# Altium schematic symbol library Electronic Devices_LIB.SchLib: 703 symbols (part 1 of 8) (continued)
## CAP_1UF_25V_X5R_0402
designator C?, comment Voltage Rating: 25V  Capacitance: 1uF  Case Code (Imperial): 0402  (hidden comment: GRM155R61E105KA12D)
Multilayer Ceramic Capacitor, 1 uF, 25 V, ± 10%, X5R, 0402 [1005 Metric]; Manufacturer: Murata; Supplier 1: Digi-Key; Manufacturer Part Number: GRM155R61E105KA12D; RoHS: Yes; Category: Ceramic Capacitors; Stock 1: 849086; Pricing 1: 1=0.1, 10=0.043, 50=0.0246, 100=0.019, 500=0.01434, 1000=0.01126, 2500=0.01024, 5000=0.00942 (USD); Mount: Surface Mount; Case/Package: 0402; Case Code (Metric): 1005; Material: Ceramic; Weight: 0.000212oz; Min Operating Temperature: -55°C; Max Operating Temperature: 85°C; Tolerance: 10%; Packaging: Cut Tape; Dielectric: X5R; Voltage: 25V; Termination: SMD/SMT; Voltage Rating (DC): 25V; Package Quantity: 10000; Series: GRM; Length: 1mm; Width: 0.5mm; Height: 0.5mm; Thickness: 0.022inch; Depth: 0.5mm; Reach SVHC Compliant: No; Lead Free: Lead Free; RoHS Compliant: Yes; ComponentLink1URL: https://datasheet.ciiva.com/7719/1666664-7719006.pdf?src-supplier=Element14; ComponentLink1Description: https://datasheet.ciiva.com/7719/1666664-7719006.pdf?src-supplier=Element14; ComponentLink2URL: https://datasheet.ciiva.com/22732/1666664-22732122.pdf?src-supplier=Element14; ComponentLink2Description: https://datasheet.ciiva.com/22732/1666664-22732122.pdf?src-supplier=Element14; Supplier Part Number 1: 490-10017-1-ND
footprint CAP_0402_CAPC1005X05N (Chip Capacitor, 2-Leads, Body 1.00x0.50mm, IPC Medium Density)
pins: 1, 2

## CAP_1uF_25V_X7R_0603
designator C?, comment Voltage Rating: 25V  Capacitance: 1uF  Case/Package: 0603  (hidden comment: GCM188R71E105KA64D)
Multilayer Ceramic Capacitor, 1 uF, 25 V, ± 10%, X7R, 0603 [1608 Metric]; Manufacturer: Murata; Material: 4241ConductorMaterial; Supplier 1: Mouser; Manufacturer Part Number: GCM188R71E105KA64D; RoHS: Yes; Category: Ceramic Capacitors; Stock 1: 413087; Pricing 1: 1=0.22, 10=0.089, 50=0.089, 100=0.052, 1000=0.046, 10000=0.035 (USD); Mount: Surface Mount; Case Code (Metric): 1608; Case Code (Imperial): 0603; Weight: 0.000222oz; Min Operating Temperature: -55°C; Max Operating Temperature: 125°C; Tolerance: 10%; Packaging: Tape and Reel; Dielectric: X7R; Voltage: 25V; Termination: SMD/SMT; Voltage Rating (DC): 25V; Package Quantity: 4000; Series: GCM; Construction: Flat; Length: 1.6mm; Width: 0.031inch; Height: 0.8mm; Thickness: 0.035inch; Depth: 0.8mm; Ratings: AEC-Q200; Radiation Hardening: No; Reach SVHC Compliant: No; Lead Free: Lead Free; RoHS Compliant: Yes; ComponentLink1URL: https://datasheet.ciiva.com/11616/product-11616499.pdf?src-supplier=Avnet; ComponentLink1Description: https://datasheet.ciiva.com/11616/product-11616499.pdf?src-supplier=Avnet; Supplier Part Number 1: 81-GCM188R71E105KA4D
footprint CAP_0603_CAPC1608X08N (Chip Capacitor, 2-Leads, Body 1.60x0.80mm, IPC Medium Density)
pins: 1, 2

## CAP_1uF_35V_JB_0402
designator C?, comment Voltage Rating: 35V  Capacitance: 1uF  Case/Package: 0402  (hidden comment: C1005JB1V105K050BC)
Cap Ceramic 1uF 35V JB 10% SMD 0402 85°C Punched Paper T/R; Manufacturer: TDK; Material: 4241ConductorMaterial; Supplier 1: Digikey; Manufacturer Part Number: C1005JB1V105K050BC; RoHS: Yes; Category: Ceramic Capacitors; Stock 1: 17379; Pricing 1: 1=0.17, 10=0.095, 50=0.0662, 100=0.0574, 500=0.04248, 1000=0.03785, 2500=0.03294, 5000=0.02996 (USD); Mount: Surface Mount; Case Code (Metric): 1005; Case Code (Imperial): 0402; Weight: 0.001199oz; Dielectric Material: Ceramic; Min Operating Temperature: -25°C; Max Operating Temperature: 85°C; Package Quantity: 10000; Packaging: Tape and Reel; Tolerance: 10%; Termination: SMD/SMT; Voltage Rating (DC): 35V; Series: C; Length: 0.039inch; Width: 0.02inch; Height: 550um; Thickness: 0.022inch; Lead Free: Lead Free; RoHS Compliant: Yes; ComponentLink1URL: https://datasheet.ciiva.com/14885/tdkmlcccaprange-14885800.pdf?src-supplier=Digikey; ComponentLink1Description: https://datasheet.ciiva.com/14885/tdkmlcccaprange-14885800.pdf?src-supplier=Digikey; ComponentLink2URL: https://datasheet.ciiva.com/14885/tdkmlcccaprange-14885801.pdf?src-supplier=Digikey; ComponentLink2Description: https://datasheet.ciiva.com/14885/tdkmlcccaprange-14885801.pdf?src-supplier=Digikey; ComponentLink3URL: https://datasheet.ciiva.com/14885/tdkmlcccaprange-14885802.pdf?src-supplier=Digikey; ComponentLink3Description: https://datasheet.ciiva.com/14885/tdkmlcccaprange-14885802.pdf?src-supplier=Digikey; Supplier Part Number 1: 445-11014-1-ND
footprint CAP_0402_CAPC1005X05N (Chip Capacitor, 2-Leads, Body 1.00x0.50mm, IPC Medium Density)
pins: 1, 2

## CAP_1uF_35V_X5R_0603
designator C?, comment GMK107BJ105KA-T  Voltage Rating (DC): 35V  Capacitance: 1uF  Case/Package: 0603
Multilayer Ceramic Capacitors (High dielectric type), 35V, 1 uF, ± 10 %, 0603, X5R, RoHS; Manufacturer: Taiyo Yuden; Dielectric Material: 4241ConductorMaterial; Tolerance: 10%; Supplier 1: Digikey; Manufacturer Part Number: GMK107BJ105KA-T; RoHS: Yes; Category: Ceramic Capacitors; Stock 1: 1326938; Pricing 1: 1=0.17, 10=0.108, 50=0.0682, 100=0.0545, 500=0.0394, 1000=0.03484 (USD); Mount: Surface Mount; Case Code (Metric): 1608; Case Code (Imperial): 0603; Material: 4241ConductorMaterial; Min Operating Temperature: -55°C; Max Operating Temperature: 85°C; Packaging: Tape and Reel; Dielectric: X5R; Voltage Rating: 35V; Package Quantity: 4000; Termination: SMD/SMT; Series: M; Construction: Flat; Length: 1.6mm; Width: 0.8mm; Height: 0.8mm; Depth: 0.8mm; Radiation Hardening: No; Halogen Free: 5694HalogenFree; RoHS Compliant: Yes; Lead Free: 5697LeadFree; Reach SVHC Compliant: No; ComponentLink1URL: https://datasheet.ciiva.com/134/gmk107bj105ka-t-ss-134746.pdf?src-supplier=Digikey; ComponentLink1Description: https://datasheet.ciiva.com/134/gmk107bj105ka-t-ss-134746.pdf?src-supplier=Digikey; ComponentLink2URL: https://datasheet.ciiva.com/30065/198gmk107bj105ka-t-30065053.pdf?src-supplier=Onlinecomponents.com; ComponentLink2Description: https://datasheet.ciiva.com/30065/198gmk107bj105ka-t-30065053.pdf?src-supplier=Onlinecomponents.com; ComponentLink3URL: https://datasheet.ciiva.com/11463/gmk107bj105ka-t-ss-11463824.pdf?src-supplier=Avnet; ComponentLink3Description: https://datasheet.ciiva.com/11463/gmk107bj105ka-t-ss-11463824.pdf?src-supplier=Avnet; ComponentLink4URL: https://datasheet.ciiva.com/15920/1014gmk107bj105ka-t-15920678.pdf?src-supplier=Onlinecomponents.com; ComponentLink4Description: https://datasheet.ciiva.com/15920/1014gmk107bj105ka-t-15920678.pdf?src-supplier=Onlinecomponents.com; ComponentLink5URL: https://datasheet.ciiva.com/26871/getdatasheetpartid-637436-26871549.pdf?src-supplier=Verical; ComponentLink5Description: https://datasheet.ciiva.com/26871/getdatasheetpartid-637436-26871549.pdf?src-supplier=Verical; ComponentLink6URL: https://datasheet.ciiva.com/30181/9gmk107bj105ka-t-30181659.pdf?src-supplier=Onlinecomponents.com; ComponentLink6Description: https://datasheet.ciiva.com/30181/9gmk107bj105ka-t-30181659.pdf?src-supplier=Onlinecomponents.com; ComponentLink7URL: https://datasheet.ciiva.com/5415/mlcc-all-e-541559-5415038.pdf?src-supplier=Mouser; ComponentLink7Description: https://datasheet.ciiva.com/5415/mlcc-all-e-541559-5415038.pdf?src-supplier=Mouser; Supplier Part Number 1: 587-1437-6-ND
footprint CAP_0603_CAPC1608X08N (Chip Capacitor, 2-Leads, Body 1.60x0.80mm, IPC Medium Density)
pins: 1, 2

## CAP_1uF_250V_X7R_2220
designator C?, comment Voltage Rating: 250V  Capacitance: 1uF  Case/Package: 2220  (hidden comment: CGA9N3X7R2E105K230KA)
Multilayer Ceramic Capacitor, 1 uF, 250 V, ± 10%, X7R, 2220 [5750 Metric]; Manufacturer: TDK; Material: 4241ConductorMaterial; Supplier 1: Mouser; Manufacturer Part Number: CGA9N3X7R2E105K230KA; RoHS: Yes; Category: Ceramic Capacitors; Stock 1: 19484; Pricing 1: 1=1.01, 10=0.807, 50=0.807, 100=0.606, 500=0.458, 1000=0.404, 2500=0.377, 5000=0.363, 10000=0.343, 25000=0.336 (USD); Mount: Surface Mount; Case Code (Metric): 5750; Case Code (Imperial): 2220; Weight: 0.016932oz; Min Operating Temperature: -55°C; Max Operating Temperature: 125°C; Tolerance: 10%; Packaging: Tape and Reel; Termination: SMD/SMT; Series: CGA; Package Quantity: 500; Voltage Rating (DC): 250V; Dielectric: X7R; Length: 5.7mm; Width: 0.197inch; Height: 2.3mm; Thickness: 0.091inch; Depth: 5mm; Ratings: AEC-Q200; Reach SVHC Compliant: No; Lead Free: Lead Free; RoHS Compliant: Yes; ComponentLink1URL: https://datasheet.ciiva.com/46443/1839935-46443611.pdf?src-supplier=Element14; ComponentLink1Description: https://datasheet.ciiva.com/46443/1839935-46443611.pdf?src-supplier=Element14; ComponentLink2URL: https://datasheet.ciiva.com/46443/1839935-46443610.pdf?src-supplier=Element14; ComponentLink2Description: https://datasheet.ciiva.com/46443/1839935-46443610.pdf?src-supplier=Element14; ComponentLink3URL: https://datasheet.ciiva.com/24216/mlcc-automotive-midvoltage-en-355485-24216919.pdf?src-supplier=Mouser; ComponentLink3Description: https://datasheet.ciiva.com/24216/mlcc-automotive-midvoltage-en-355485-24216919.pdf?src-supplier=Mouser; Supplier Part Number 1: 810-CGA9N3X7R2E105K
footprint CAP_2220_CAPC5750X25N (Chip Capacitor, 2-Leads, Body 5.70x5.00mm, IPC Medium Density)
pins: 1, 2

## CAP_01uF_275V_Film_cap_890324023023
designator C?, comment Capacitance: 100nF  Voltage Rating (AC): 275V  (hidden comment: 890324023023)
WCAP-FTX2 Radial Film Capacitor 0.512Lx0.276W 13.00mmx7.00mm ±10% 0.1muF 275V; Manufacturer: Wurth Electronics; Dielectric Material: PP; Ratings: X2; Supplier 1: Digikey; Manufacturer Part Number: 890324023023; RoHS: Yes; Category: Film Capacitors; Stock 1: 3473; Pricing 1: 1=0.43, 50=0.37, 100=0.322, 250=0.286, 500=0.25, 1000=0.239 (USD); Mount: Through Hole; Case/Package: Radial; Min Operating Temperature: -40°C; Max Operating Temperature: 105°C; Dielectric: PP; Termination: PC Pins; Tolerance: 10%; Series: WCAP-FTX2; Lead Pitch: 10mm; RoHS Compliant: Yes; Reach SVHC Compliant: Unknown; ComponentLink1URL: http://www.farnell.com/datasheets/1867961.pdf?src-supplier=Farnell; ComponentLink1Description: http://www.farnell.com/datasheets/1867961.pdf?src-supplier=Farnell; ComponentLink2URL: https://katalog.we-online.de/pbs/datasheet/890324023023.pdf?src-supplier=Digikey; ComponentLink2Description: https://katalog.we-online.de/pbs/datasheet/890324023023.pdf?src-supplier=Digikey; ComponentLink3URL: http://www.farnell.com/datasheets/1867961.pdf?src-supplier=Element14; ComponentLink3Description: http://www.farnell.com/datasheets/1867961.pdf?src-supplier=Element14; ComponentLink4URL: http://www.farnell.com/datasheets/1867961.pdf?src-supplier=Newark; ComponentLink4Description: http://www.farnell.com/datasheets/1867961.pdf?src-supplier=Newark; Supplier Part Number 1: 732-5883-ND
footprint CAP_FILM_890324023023
pins: 1, 2

## CAP_2.2nF_50V_NP0_0402
designator C?, comment Case/Package: 0603  Voltage Rating: 50V  Capacitance: 2.2nF  (hidden comment: GRM1885C1H222JA01D)
Multilayer Ceramic Capacitor, 2200 pF, 50 V, ï¿½ 5%, C0G (NP0), 0603 [1608 Metric]; Manufacturer: Murata; Insulation Resistance: 10GR; Temperature Coefficient: 30ppm/°C; Supplier 1: Digikey; Manufacturer Part Number: GRM1885C1H222JA01D; RoHS: Yes; Category: Ceramic Capacitors; Stock 1: 228613; Pricing 1: 1=0.1, 10=0.045, 50=0.0306, 100=0.0262, 500=0.01882, 1000=0.01654 (USD); Mount: Surface Mount; Number of Pins: 2; Case Code (Imperial): 0603; Case Code (Metric): 1608; Material: Ceramic; Dielectric Material: Ceramic; Min Operating Temperature: -55°C; Max Operating Temperature: 125°C; Tolerance: 5%; Packaging: Tape and Reel; Voltage Rating (DC): 50V; Package Quantity: 1; Dielectric: C0G; Termination: SMD/SMT; Voltage: 50V; Series: GRM; Construction: Flat; Length: 1.6mm; Width: 0.031inch; Height: 0.8mm; Thickness: 0.035inch; Depth: 0.8mm; Reach SVHC Compliant: No; Lead Free: Lead Free; RoHS Compliant: Yes; ComponentLink1URL: https://datasheet.ciiva.com/3777/1632grm1885c1h222ja0123-3777835.pdf?src-supplier=Arrow+Electronics; ComponentLink1Description: https://datasheet.ciiva.com/3777/1632grm1885c1h222ja0123-3777835.pdf?src-supplier=Arrow+Electronics; ComponentLink2URL: https://datasheet.ciiva.com/11786/0900766b807a1cab-11786840.pdf?src-supplier=Rs; ComponentLink2Description: https://datasheet.ciiva.com/11786/0900766b807a1cab-11786840.pdf?src-supplier=Rs; ComponentLink3URL: https://datasheet.ciiva.com/133/partnumbering-e-01-133576.pdf?src-supplier=Digikey; ComponentLink3Description: https://datasheet.ciiva.com/133/partnumbering-e-01-133576.pdf?src-supplier=Digikey; ComponentLink4URL: https://datasheet.ciiva.com/133/partnumbering-e-01-133577.pdf?src-supplier=Digikey; ComponentLink4Description: https://datasheet.ciiva.com/133/partnumbering-e-01-133577.pdf?src-supplier=Digikey; ComponentLink5URL: https://datasheet.ciiva.com/133/partnumbering-e-01-133578.pdf?src-supplier=Digikey; ComponentLink5Description: https://datasheet.ciiva.com/133/partnumbering-e-01-133578.pdf?src-supplier=Digikey; ComponentLink6URL: https://datasheet.ciiva.com/11463/product-11463974.pdf?src-supplier=Avnet; ComponentLink6Description: https://datasheet.ciiva.com/11463/product-11463974.pdf?src-supplier=Avnet; ComponentLink7URL: https://datasheet.ciiva.com/2989/product-2989459.pdf?src-supplier=Avnet; ComponentLink7Description: https://datasheet.ciiva.com/2989/product-2989459.pdf?src-supplier=Avnet; ComponentLink8URL: https://datasheet.ciiva.com/6031/4360-6031797.pdf?src-supplier=Farnell; ComponentLink8Description: https://datasheet.ciiva.com/6031/4360-6031797.pdf?src-supplier=Farnell; ComponentLink9URL: https://datasheet.ciiva.com/7828/4360-7828918.pdf?src-supplier=Element14; ComponentLink9Description: https://datasheet.ciiva.com/7828/4360-7828918.pdf?src-supplier=Element14; ComponentLink10URL: https://datasheet.ciiva.com/7828/1747455-7828919.pdf?src-supplier=Element14; ComponentLink10Description: https://datasheet.ciiva.com/7828/1747455-7828919.pdf?src-supplier=Element14; ComponentLink11URL: https://datasheet.ciiva.com/7828/1747455-7828920.pdf?src-supplier=Element14; ComponentLink11Description: https://datasheet.ciiva.com/7828/1747455-7828920.pdf?src-supplier=Element14; Supplier Part Number 1: 490-1459-1-ND
footprint CAP_0603_CAPC1608X08N (Chip Capacitor, 2-Leads, Body 1.60x0.80mm, IPC Medium Density)
pins: 1, 2

## CAP_2.2PF_50V_NP0_0603
designator C?, comment Capacitance: 2.2pF  Voltage Rating: 50V  Case/Package: 0603  (hidden comment: CC0603CRNPO9BN2R2)
Surface Mount Ceramic Multilayer Capacitor 2.2pF 0.25pF C0G 50V 0603 Paper T/R; Manufacturer: Yageo; Tolerance: 5%; Temperature Coefficient: 30ppm/°C; Insulation Resistance: 100GR; Supplier 1: Digi-Key; Manufacturer Part Number: CC0603CRNPO9BN2R2; RoHS: Yes; Category: Ceramic Capacitors; Stock 1: 119291; Pricing 1: 1=0.1, 10=0.051, 50=0.028, 100=0.0228, 500=0.0163, 1000=0.0128 (USD); Mount: Surface Mount; Number of Pins: 2; Case Code (Imperial): 0603; Case Code (Metric): 1608; Min Operating Temperature: -55°C; Max Operating Temperature: 125°C; Dielectric: C0G; Voltage Rating (DC): 50V; Packaging: Tape and Reel; Package Quantity: 4000; Termination: SMD/SMT; Voltage: 50V; Series: CC; Length: 1.6mm; Width: 0.031inch; Height: 0.8mm; Thickness: 0.035inch; Depth: 0.8mm; Radiation Hardening: No; Lead Free: Lead Free; RoHS Compliant: Yes; Reach SVHC Compliant: Unknown; ComponentLink1URL: https://datasheet.ciiva.com/11786/0900766b8079c870-11786437.pdf?src-supplier=Rs; ComponentLink1Description: https://datasheet.ciiva.com/11786/0900766b8079c870-11786437.pdf?src-supplier=Rs; ComponentLink2URL: https://datasheet.ciiva.com/5425/upy-gp-np0-16v-to-50v-8-5425498.pdf?src-supplier=Mouser; ComponentLink2Description: https://datasheet.ciiva.com/5425/upy-gp-np0-16v-to-50v-8-5425498.pdf?src-supplier=Mouser; ComponentLink3URL: https://datasheet.ciiva.com/11586/upy-gp-np0-16v-to-50v-8-11586441.pdf?src-supplier=Avnet; ComponentLink3Description: https://datasheet.ciiva.com/11586/upy-gp-np0-16v-to-50v-8-11586441.pdf?src-supplier=Avnet; ComponentLink4URL: https://datasheet.ciiva.com/8033/1443161-8033688.pdf?src-supplier=Element14; ComponentLink4Description: https://datasheet.ciiva.com/8033/1443161-8033688.pdf?src-supplier=Element14; ComponentLink5URL: https://datasheet.ciiva.com/8033/1443161-8033691.pdf?src-supplier=Element14; ComponentLink5Description: https://datasheet.ciiva.com/8033/1443161-8033691.pdf?src-supplier=Element14; Supplier Part Number 1: 311-1739-1-ND
footprint CAP_0603_CAPC1608X08N (Chip Capacitor, 2-Leads, Body 1.60x0.80mm, IPC Medium Density)
pins: 1, 2

## CAP_2.2UF_10V_X5R_0402
designator C?, comment Voltage Rating (DC): 10V  Capacitance: 2.2uF  Case/Package: 0402  (hidden comment: C1005X5R1A225K050BC)
Multilayer Ceramic Capacitor, 2.2 uF, 10 V, ± 10%, X5R, 0402 [1005 Metric]; Manufacturer: TDK; Material: 4241ConductorMaterial; Supplier 1: Digi-Key; Manufacturer Part Number: C1005X5R1A225K050BC; RoHS: Yes; Category: Ceramic Capacitors; Stock 1: 748837; Pricing 1: 1=0.3, 10=0.196, 50=0.1376, 100=0.1111, 500=0.08256, 1000=0.07224, 2500=0.0688, 5000=0.06364 (USD); Mount: Surface Mount; Number of Pins: 2; Dielectric Material: Ceramic; Case Code (Metric): 1005; Case Code (Imperial): 0402; Weight: 2.3E-05oz; Min Operating Temperature: -55°C; Max Operating Temperature: 85°C; Tolerance: 10%; Dielectric: X5R; Packaging: Tape and Reel; Construction: Flat; Voltage Rating: 10V; Package Quantity: 10000; Termination: SMD/SMT; Voltage: 10V; Series: C; Length: 1mm; Width: 0.5mm; Height: 0.5mm; Depth: 0.5mm; Lead Free: Lead Free; RoHS Compliant: Yes; Reach SVHC Compliant: No; ComponentLink1URL: https://datasheet.ciiva.com/24216/c1005x5r1a225k050bc-264297-24216439.pdf?src-supplier=Mouser; ComponentLink1Description: https://datasheet.ciiva.com/24216/c1005x5r1a225k050bc-264297-24216439.pdf?src-supplier=Mouser; ComponentLink2URL: https://datasheet.ciiva.com/6289/tdkmlcccaprange-6289823.pdf?src-supplier=Digi-Key; ComponentLink2Description: https://datasheet.ciiva.com/6289/tdkmlcccaprange-6289823.pdf?src-supplier=Digi-Key; ComponentLink3URL: https://datasheet.ciiva.com/6289/tdkmlcccaprange-6289830.pdf?src-supplier=Digi-Key; ComponentLink3Description: https://datasheet.ciiva.com/6289/tdkmlcccaprange-6289830.pdf?src-supplier=Digi-Key; ComponentLink4URL: https://datasheet.ciiva.com/22719/1796654-22719527.pdf?src-supplier=Element14; ComponentLink4Description: https://datasheet.ciiva.com/22719/1796654-22719527.pdf?src-supplier=Element14; ComponentLink5URL: https://datasheet.ciiva.com/28451/1796654-28451002.pdf?src-supplier=Element14; ComponentLink5Description: https://datasheet.ciiva.com/28451/1796654-28451002.pdf?src-supplier=Element14; ComponentLink6URL: https://datasheet.ciiva.com/28665/mlcc-commercial-general-en-28665493.pdf?src-supplier=Element14; ComponentLink6Description: https://datasheet.ciiva.com/28665/mlcc-commercial-general-en-28665493.pdf?src-supplier=Element14; ComponentLink7URL: https://datasheet.ciiva.com/23802/1796654-23802731.pdf?src-supplier=Newark; ComponentLink7Description: https://datasheet.ciiva.com/23802/1796654-23802731.pdf?src-supplier=Newark; ComponentLink8URL: https://datasheet.ciiva.com/16425/general-b11-16425676.pdf?src-supplier=Future+Electronics; ComponentLink8Description: https://datasheet.ciiva.com/16425/general-b11-16425676.pdf?src-supplier=Future+Electronics; Supplier Part Number 1: 445-7392-1-ND
footprint CAP_0201_CAPC0603X03N (Chip Capacitor, 2-Leads, Body 0.60x0.30mm, IPC Medium Density)
pins: 1, 2

## CAP_2.2uF_16V_X5R_0201
designator C?, comment Capacitance: 2.2uF  Voltage Rating: 16V  Case/Package: 0201  (hidden comment: GRM035R61C225ME01D)
General Up to 85C Reflow soldering; Manufacturer: Murata; Material: Ceramic; Dielectric: X5R; Tolerance: 20%; Supplier 1: Digikey; Manufacturer Part Number: GRM035R61C225ME01D; RoHS: No; Category: Ceramic Capacitors; Stock 1: 18674; Pricing 1: 1=0.36, 10=0.233, 50=0.1636, 100=0.1321, 500=0.09814, 1000=0.08587, 2500=0.08178, 5000=0.07565 (USD); Min Operating Temperature: -55°C; Max Operating Temperature: 85°C; Voltage Rating (DC): 16V; Length: 600um; Width: 300um; Height: 550um; Thickness: 500um; RoHS Compliant: Yes; ComponentLink1URL: https://datasheet.octopart.com/GRM035R61C225ME01D-Murata-datasheet-165579666.pdf?src-supplier=TME; ComponentLink1Description: https://datasheet.octopart.com/GRM035R61C225ME01D-Murata-datasheet-165579666.pdf?src-supplier=TME; Supplier Part Number 1: 490-GRM035R61C225ME01DCT-ND
footprint CAP_0201_CAPC0603X03N (Chip Capacitor, 2-Leads, Body 0.60x0.30mm, IPC Medium Density)
pins: 1, 2

## CAP_2.2UF_16V_X7R_0603
designator C?, comment Case/Package: 0603  Capacitance: 2.2uF  Voltage Rating: 16V  (hidden comment: EMK107BB7225KA-T)
Multilayer Ceramic Capacitors (High dielectric type), 16V, 2.2 uF, ± 10 %, 0603, X7R, RoHS; Manufacturer: Taiyo Yuden; Material: 4241ConductorMaterial; Tolerance: 10%; Supplier 1: Digikey; Manufacturer Part Number: EMK107BB7225KA-T; RoHS: Yes; Category: Ceramic Capacitors; Stock 1: 390946; Pricing 1: 1=0.27, 10=0.177, 50=0.124, 100=0.1002, 500=0.07442, 1000=0.06511 (USD); Mount: Surface Mount; Case Code (Imperial): 0603; Case Code (Metric): 1608; Min Operating Temperature: -55°C; Max Operating Temperature: 125°C; Packaging: Cut Tape; Voltage Rating (DC): 16V; Series: M; Length: 0.063inch; Width: 0.031inch; Height: 1mm; Thickness: 0.035inch; Halogen Free: Halogen Free; RoHS Compliant: Yes; ComponentLink1URL: http://www.yuden.co.jp/productdata/catalog/en/mlcc06_e.pdf?src-supplier=Digikey; ComponentLink1Description: http://www.yuden.co.jp/productdata/catalog/en/mlcc06_e.pdf?src-supplier=Digikey; ComponentLink2URL: http://ds.yuden.co.jp/TYCOMPAS/ut/detail.do?productNo=EMK107BB7225KA-T&fileName=EMK107BB7225KA-T_SS&mode=specSheetDownload&src-supplier=Digikey; ComponentLink2Description: http://ds.yuden.co.jp/TYCOMPAS/ut/detail.do?productNo=EMK107BB7225KA-T&fileName=EMK107BB7225KA-T_SS&mode=specSheetDownload&src-supplier=Digikey; ComponentLink3URL: https://ds.yuden.co.jp/TYCOMPAS/ut/detail?pn=EMK107BB7225KA-T  &amp;u=M&src-supplier=Digikey; ComponentLink3Description: https://ds.yuden.co.jp/TYCOMPAS/ut/detail?pn=EMK107BB7225KA-T  &amp;u=M&src-supplier=Digikey; ComponentLink4URL: http://ds3.yuden.co.jp/TYCOMPAS/ut/detail.do?productNo=EMK107BB7225KA-T&dataUnit=M&src-supplier=Avnet; ComponentLink4Description: http://ds3.yuden.co.jp/TYCOMPAS/ut/detail.do?productNo=EMK107BB7225KA-T&dataUnit=M&src-supplier=Avnet; ComponentLink5URL: https://datasheet.octopart.com/EMK107BB7225KA-T-Taiyo-Yuden-datasheet-99833418.pdf?src-supplier=Future+Electronics; ComponentLink5Description: https://datasheet.octopart.com/EMK107BB7225KA-T-Taiyo-Yuden-datasheet-99833418.pdf?src-supplier=Future+Electronics; ComponentLink6URL: https://datasheet.octopart.com/EMK107BB7225KA-T-Taiyo-Yuden-datasheet-154808275.pdf?src-supplier=Master+Electronics; ComponentLink6Description: https://datasheet.octopart.com/EMK107BB7225KA-T-Taiyo-Yuden-datasheet-154808275.pdf?src-supplier=Master+Electronics; Supplier Part Number 1: 587-5835-1-ND
footprint CAP_0603_CAPC1608X08N (Chip Capacitor, 2-Leads, Body 1.60x0.80mm, IPC Medium Density)
pins: 1, 2

## CAP_2PF_50V_NP0_0603
designator C?, comment Capacitance: 2pF  Voltage Rating: 50V  Case/Package: 0603  (hidden comment: CC0603BRNPO9BN2R0)
CAP CER 2PF 50V NPO 0603; Manufacturer: Yageo; Dielectric: C0G; Insulation Resistance: 10GR; Supplier 1: Digi-Key; Manufacturer Part Number: CC0603BRNPO9BN2R0; RoHS: Yes; Category: Ceramic Capacitors; Stock 1: 8024; Pricing 1: 1=0.1, 10=0.077, 50=0.0418, 100=0.0342, 500=0.02442, 1000=0.01919 (USD); Mount: Surface Mount; Case Code (Imperial): 0603; Case Code (Metric): 1608; Min Operating Temperature: -55°C; Max Operating Temperature: 125°C; Packaging: Tape and Reel; Package Quantity: 4000; Voltage Rating (DC): 50V; Termination: SMD/SMT; Series: CC; Construction: Flat; Length: 1.6mm; Width: 0.8mm; Height: 0.8mm; Thickness: 0.035inch; Depth: 0.8mm; Radiation Hardening: No; Lead Free: Lead Free; ComponentLink1URL: https://datasheet.ciiva.com/11586/upy-gp-np0-16v-to-50v-8-11586542.pdf?src-supplier=Avnet; ComponentLink1Description: https://datasheet.ciiva.com/11586/upy-gp-np0-16v-to-50v-8-11586542.pdf?src-supplier=Avnet; ComponentLink2URL: https://datasheet.ciiva.com/5425/upy-gp-np0-16v-to-50v-8-5425550.pdf?src-supplier=Mouser; ComponentLink2Description: https://datasheet.ciiva.com/5425/upy-gp-np0-16v-to-50v-8-5425550.pdf?src-supplier=Mouser; Supplier Part Number 1: 311-3827-1-ND
footprint CAP_0603_CAPC1608X08N (Chip Capacitor, 2-Leads, Body 1.60x0.80mm, IPC Medium Density)
pins: 1, 2

## CAP_3.3NF_6.3V_X7R_0201
designator C?, comment GRM033R70J332KA01D  Voltage Rating: 6.3V  Capacitance: 3.3nF  Case/Package: 0201
Multilayer Ceramic Capacitor, 3300 pF, 6.3 V, ± 10%, X7R, 0201 [0603 Metric]; Manufacturer: Murata; Material: 4241ConductorMaterial; Supplier 1: Digi-Key; Manufacturer Part Number: GRM033R70J332KA01D; RoHS: Yes; Category: Ceramic Capacitors; Stock 1: 38076; Pricing 1: 1=0.1, 10=0.01, 50=0.0056, 100=0.0043, 500=0.00324, 1000=0.00255, 2500=0.00232, 5000=0.00213 (USD); Mount: Surface Mount; Case Code (Imperial): 0201; Case Code (Metric): 0603; Weight: 6E-06oz; Min Operating Temperature: -55°C; Max Operating Temperature: 125°C; Voltage Rating (DC): 6.3V; Tolerance: 10%; Packaging: Tape and Reel; Package Quantity: 1; Dielectric: X7R; Termination: SMD/SMT; Series: GRM; Construction: Flat; Length: 0.6mm; Width: 0.012inch; Height: 0.3mm; Thickness: 0.013inch; Depth: 0.3mm; Radiation Hardening: No; Lead Free: Lead Free; RoHS Compliant: Yes; ComponentLink1URL: https://datasheet.ciiva.com/15376/product-15376033.pdf?src-supplier=Mouser; ComponentLink1Description: https://datasheet.ciiva.com/15376/product-15376033.pdf?src-supplier=Mouser; ComponentLink2URL: https://datasheet.ciiva.com/29542/grm033r70j332ka01-01-29542506.pdf?src-supplier=Digi-Key; ComponentLink2Description: https://datasheet.ciiva.com/29542/grm033r70j332ka01-01-29542506.pdf?src-supplier=Digi-Key; ComponentLink3URL: https://datasheet.ciiva.com/29542/partnumbering-e-01-29542507.pdf?src-supplier=Digi-Key; ComponentLink3Description: https://datasheet.ciiva.com/29542/partnumbering-e-01-29542507.pdf?src-supplier=Digi-Key; ComponentLink4URL: https://datasheet.ciiva.com/29542/partnumbering-e-01-29542508.pdf?src-supplier=Digi-Key; ComponentLink4Description: https://datasheet.ciiva.com/29542/partnumbering-e-01-29542508.pdf?src-supplier=Digi-Key; Supplier Part Number 1: 490-8158-1-ND
footprint CAP_0201_CAPC0603X03N (Chip Capacitor, 2-Leads, Body 0.60x0.30mm, IPC Medium Density)
pins: 1, 2

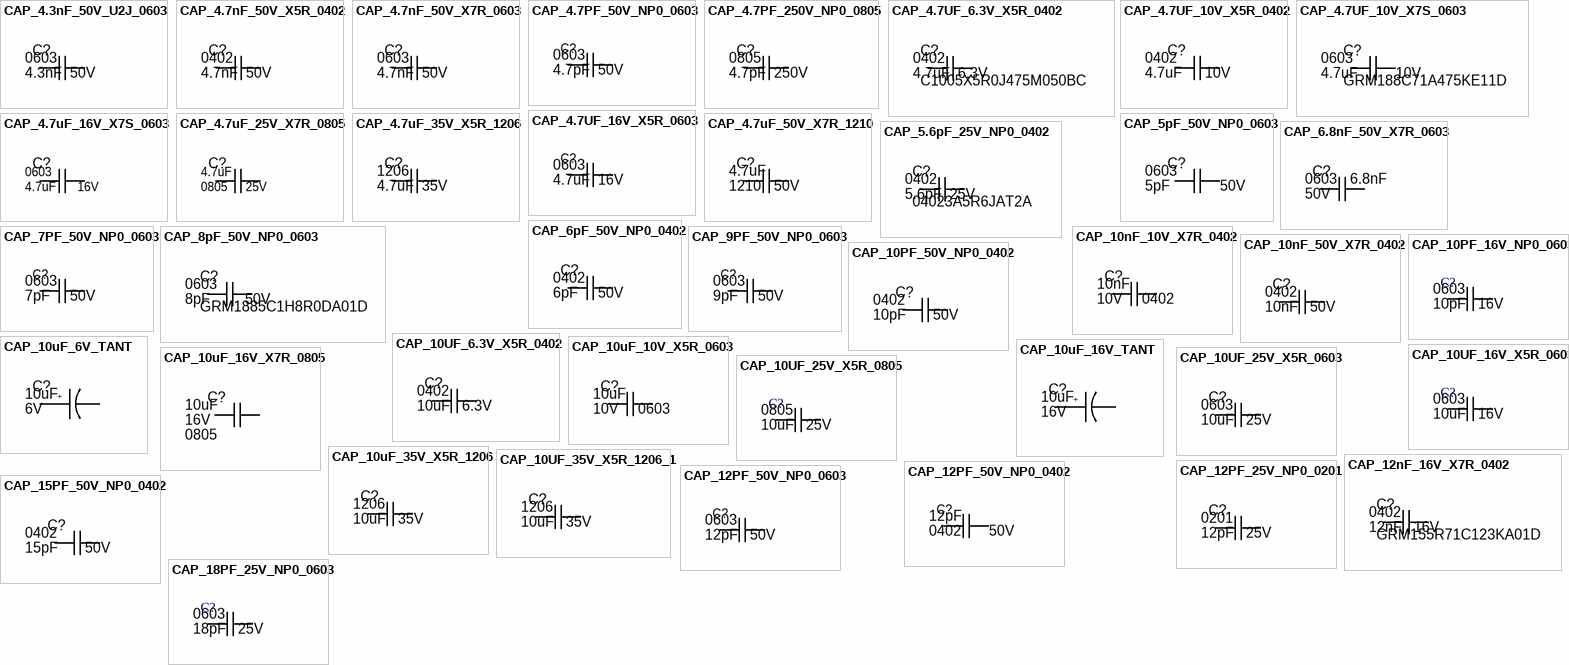
[diagram p1: symbols CAP_4.3nF_50V_U2J_0603 to CAP_18PF_25V_NP0_0603]

## CAP_4.3nF_50V_U2J_0603
designator C?, comment Capacitance: 4.3nF  Voltage Rating: 50V  Case/Package: 0603  (hidden comment: GRM1887U1H432JA01D)
Cap Ceramic 0.0043uF 50V U2J 5% SMD 0603 125°C Paper T/R; Manufacturer: Murata; Supplier 1: Digikey; Manufacturer Part Number: GRM1887U1H432JA01D; RoHS: Yes; Category: Ceramic Capacitors; Stock 1: 119947; Pricing 1: 1=0.26, 10=0.171, 50=0.108, 100=0.0864, 500=0.0624, 1000=0.0552 (USD); Mount: Surface Mount; Case Code (Metric): 1608; Case Code (Imperial): 0603; Min Operating Temperature: -55°C; Max Operating Temperature: 125°C; Tolerance: 5%; Packaging: Tape and Reel; Package Quantity: 1; Voltage Rating (DC): 50V; Dielectric: U2J; Termination: SMD/SMT; Series: GRM; Construction: Flat; Length: 1.6mm; Width: 0.031inch; Height: 0.8mm; Thickness: 0.035inch; Depth: 0.8mm; Radiation Hardening: No; RoHS Compliant: Yes; ComponentLink1URL: https://datasheet.ciiva.com/5417/product-5417078.pdf?src-supplier=Mouser; ComponentLink1Description: https://datasheet.ciiva.com/5417/product-5417078.pdf?src-supplier=Mouser; ComponentLink2URL: https://datasheet.ciiva.com/6270/partnumbering-e-01-6270485.pdf?src-supplier=Digikey; ComponentLink2Description: https://datasheet.ciiva.com/6270/partnumbering-e-01-6270485.pdf?src-supplier=Digikey; ComponentLink3URL: https://datasheet.ciiva.com/6270/partnumbering-e-01-6270486.pdf?src-supplier=Digikey; ComponentLink3Description: https://datasheet.ciiva.com/6270/partnumbering-e-01-6270486.pdf?src-supplier=Digikey; ComponentLink4URL: https://datasheet.ciiva.com/11620/c02e-11620106.pdf?src-supplier=Avnet; ComponentLink4Description: https://datasheet.ciiva.com/11620/c02e-11620106.pdf?src-supplier=Avnet; Supplier Part Number 1: 490-6397-1-ND
footprint CAP_0603_CAPC1608X08N (Chip Capacitor, 2-Leads, Body 1.60x0.80mm, IPC Medium Density)
pins: 1, 2

## CAP_4.7nF_50V_X5R_0402
designator C?, comment Voltage Rating: 50V  Capacitance: 4.7nF  Case/Package: 0402  (hidden comment: GRM155R61H472KA01D)
Cap Ceramic 0.0047uF 50V X5R 10% SMD 0402 85 Paper T/R; Manufacturer: Murata; Supplier 1: Digikey; Manufacturer Part Number: GRM155R61H472KA01D; RoHS: Yes; Category: Ceramic Capacitors; Stock 1: 61974; Pricing 1: 1=0.1, 10=0.029, 50=0.0166, 100=0.0129, 500=0.00974, 1000=0.00765, 2500=0.00695, 5000=0.0064 (USD); Mount: Surface Mount; Case Code (Metric): 1005; Case Code (Imperial): 0402; Min Operating Temperature: -55°C; Max Operating Temperature: 85°C; Tolerance: 10%; Packaging: Tape and Reel; Package Quantity: 10000; Voltage Rating (DC): 50V; Dielectric: X5R; Termination: SMD/SMT; Series: GRM; Construction: Flat; Length: 1mm; Width: 0.02inch; Height: 0.5mm; Thickness: 0.022inch; Depth: 0.5mm; Radiation Hardening: No; RoHS Compliant: Yes; ComponentLink1URL: https://datasheet.ciiva.com/6263/product-6263668.pdf?src-supplier=Digikey; ComponentLink1Description: https://datasheet.ciiva.com/6263/product-6263668.pdf?src-supplier=Digikey; ComponentLink2URL: https://datasheet.ciiva.com/6263/partnumbering-e-01-6263670.pdf?src-supplier=Digikey; ComponentLink2Description: https://datasheet.ciiva.com/6263/partnumbering-e-01-6263670.pdf?src-supplier=Digikey; ComponentLink3URL: https://datasheet.ciiva.com/11620/product-11620407.pdf?src-supplier=Avnet; ComponentLink3Description: https://datasheet.ciiva.com/11620/product-11620407.pdf?src-supplier=Avnet; ComponentLink4URL: https://datasheet.ciiva.com/6263/partnumbering-e-01-6263672.pdf?src-supplier=Digikey; ComponentLink4Description: https://datasheet.ciiva.com/6263/partnumbering-e-01-6263672.pdf?src-supplier=Digikey; Supplier Part Number 1: 490-6317-1-ND
footprint CAP_0402_CAPC1005X05N (Chip Capacitor, 2-Leads, Body 1.00x0.50mm, IPC Medium Density)
pins: 1, 2

## CAP_4.7nF_50V_X7R_0603
designator C?, comment Capacitance: 4.7nF  Voltage Rating: 50V  Case/Package: 0603  (hidden comment: GCM188R71H472KA37D)
Multilayer Ceramic Capacitor, 4700 pF, 50 V, ± 10%, X7R, 0603 [1608 Metric]; Manufacturer: Murata; Supplier 1: Digikey; Manufacturer Part Number: GCM188R71H472KA37D; RoHS: Yes; Category: Ceramic Capacitors; Stock 1: 873520; Pricing 1: 1=0.18, 10=0.122, 50=0.073, 100=0.0574, 500=0.04242, 1000=0.03511 (USD); Mount: Surface Mount; Case Code (Metric): 1608; Case Code (Imperial): 0603; Weight: 7.1E-05oz; Min Operating Temperature: -55°C; Max Operating Temperature: 125°C; Package Quantity: 1; Tolerance: 10%; Packaging: Tape and Reel; Voltage Rating (DC): 50V; Dielectric: X7R; Termination: SMD/SMT; Voltage: 50V; Series: GCM; Construction: Flat; Length: 1.6mm; Width: 0.031inch; Height: 0.8mm; Thickness: 0.035inch; Depth: 0.8mm; Ratings: AEC-Q200; Radiation Hardening: No; Reach SVHC Compliant: No; Lead Free: Lead Free; RoHS Compliant: Yes; ComponentLink1URL: https://datasheet.ciiva.com/132/product-132014.pdf?src-supplier=Digikey; ComponentLink1Description: https://datasheet.ciiva.com/132/product-132014.pdf?src-supplier=Digikey; ComponentLink2URL: https://datasheet.ciiva.com/132/product-132015.pdf?src-supplier=Digikey; ComponentLink2Description: https://datasheet.ciiva.com/132/product-132015.pdf?src-supplier=Digikey; ComponentLink3URL: https://datasheet.ciiva.com/132/product-132016.pdf?src-supplier=Digikey; ComponentLink3Description: https://datasheet.ciiva.com/132/product-132016.pdf?src-supplier=Digikey; Supplier Part Number 1: 490-4932-1-ND
footprint CAP_0603_CAPC1608X08N (Chip Capacitor, 2-Leads, Body 1.60x0.80mm, IPC Medium Density)
pins: 1, 2

## CAP_4.7PF_50V_NP0_0603
designator C?, comment Voltage Rating: 50V  Capacitance: 4.7pF  Case/Package: 0603  (hidden comment: CL10C4R7BB8NNNC)
Multilayer Ceramic Capacitor, 4.7 pF, 50 V, ± 0.1pF, C0G (NP0), 0603 [1608 Metric]; Manufacturer: Samsung; Temperature Coefficient: 300ppm/°C; Tolerance: 5%; Supplier 1: Digi-Key; Manufacturer Part Number: CL10C4R7BB8NNNC; RoHS: Yes; Category: Ceramic Capacitors; Stock 1: 190114; Pricing 1: 1=0.1, 10=0.058, 50=0.0316, 100=0.0258, 500=0.01842, 1000=0.01447 (USD); Mount: Surface Mount; Case Code (Metric): 1608; Case Code (Imperial): 0603; Material: Ceramic; Min Operating Temperature: -55°C; Max Operating Temperature: 125°C; Packaging: Tape and Reel; Package Quantity: 1; Dielectric: C0G; Voltage: 50V; Voltage Rating (DC): 50V; Series: CL; Construction: Flat; Length: 1.6mm; Width: 0.031inch; Height: 0.8mm; Thickness: 0.035inch; Depth: 0.8mm; Radiation Hardening: No; Lead Free: Lead Free; RoHS Compliant: Yes; ComponentLink1URL: https://datasheet.ciiva.com/26878/getdatasheetpartid-641110-26878010.pdf?src-supplier=Verical; ComponentLink1Description: https://datasheet.ciiva.com/26878/getdatasheetpartid-641110-26878010.pdf?src-supplier=Verical; ComponentLink2URL: https://datasheet.ciiva.com/29198/457703-da-01-en-vs-kondensator-0603-29198677.pdf?src-supplier=Conrad; ComponentLink2Description: https://datasheet.ciiva.com/29198/457703-da-01-en-vs-kondensator-0603-29198677.pdf?src-supplier=Conrad; Supplier Part Number 1: 1276-1792-1-ND
footprint CAP_0603_CAPC1608X08N (Chip Capacitor, 2-Leads, Body 1.60x0.80mm, IPC Medium Density)
pins: 1, 2

## CAP_4.7PF_250V_NP0_0805
designator C?, comment Voltage Rating: 250V  Capacitance: 4.7pF  Case/Package: 0805  (hidden comment: GQM2195C2E4R7BB12D)
Multilayer Ceramic Capacitors MLCC - SMD/SMT 0805 4.7pF 250volts C0G 0.1pF; Manufacturer: Murata; Supplier 1: Mouser; Manufacturer Part Number: GQM2195C2E4R7BB12D; RoHS: Yes; Category: Ceramic Capacitors; Stock 1: 5209; Pricing 1: 1=0.85, 10=0.66, 50=0.591, 100=0.492, 1000=0.347, 10000=0.295 (USD); Mount: Surface Mount; Case Code (Imperial): 0805; Case Code (Metric): 2012; Min Operating Temperature: -55°C; Max Operating Temperature: 125°C; Dielectric: C0G; Packaging: Tape and Reel; Voltage Rating (DC): 250V; Package Quantity: 1; Termination: SMD/SMT; Series: GQM; Construction: Flat; Length: 2mm; Width: 0.049inch; Height: 0.85mm; Depth: 1.25mm; Thickness: 0.039inch; Radiation Hardening: No; RoHS Compliant: Yes; ComponentLink1URL: https://datasheet.ciiva.com/5411/product-5411632.pdf?src-supplier=Mouser; ComponentLink1Description: https://datasheet.ciiva.com/5411/product-5411632.pdf?src-supplier=Mouser; ComponentLink2URL: https://datasheet.ciiva.com/142/partnumbering-e-01-142795.pdf?src-supplier=Digi-Key; ComponentLink2Description: https://datasheet.ciiva.com/142/partnumbering-e-01-142795.pdf?src-supplier=Digi-Key; ComponentLink3URL: https://datasheet.ciiva.com/142/partnumbering-e-01-142796.pdf?src-supplier=Digi-Key; ComponentLink3Description: https://datasheet.ciiva.com/142/partnumbering-e-01-142796.pdf?src-supplier=Digi-Key; ComponentLink4URL: https://datasheet.ciiva.com/142/partnumbering-e-01-142797.pdf?src-supplier=Digi-Key; ComponentLink4Description: https://datasheet.ciiva.com/142/partnumbering-e-01-142797.pdf?src-supplier=Digi-Key; Supplier Part Number 1: 81-GQM2195C2E4R7BB2D
footprint CAP_0805_CAPC2012X12N (Chip Capacitor, 2-Leads, Body 2.00x1.25mm, IPC Medium Density)
pins: 1, 2

## CAP_4.7UF_6.3V_X5R_0402
designator C?, comment C1005X5R0J475M050BC  Capacitance: 4.7uF  Voltage Rating: 6.3V  Case/Package: 0402
Multilayer Ceramic Capacitor, 4.7 uF, 6.3 V, ± 20%, X5R, 0402 [1005 Metric]; Manufacturer: TDK; Material: 4241ConductorMaterial; Dissipation Factor: 10%; Supplier 1: Digi-Key; Manufacturer Part Number: C1005X5R0J475M050BC; RoHS: Yes; Category: Ceramic Capacitors; Stock 1: 799722; Pricing 1: 1=0.35, 10=0.233, 50=0.1716, 100=0.1396, 500=0.11024, 1000=0.0931, 2500=0.0882, 5000=0.0833 (USD); Mount: Surface Mount; Dielectric Material: Ceramic; Case Code (Metric): 1005; Case Code (Imperial): 0402; Weight: 2.3E-05oz; Min Operating Temperature: -55°C; Max Operating Temperature: 85°C; Packaging: Tape and Reel; Tolerance: 20%; Voltage Rating (DC): 6.3V; Dielectric: X5R; Package Quantity: 1; Termination: SMD/SMT; Voltage: 6.3V; Series: C; Construction: Flat; Length: 1mm; Width: 0.02inch; Height: 0.5mm; Depth: 0.5mm; Thickness: 0.026inch; Lead Free: Lead Free; Reach SVHC Compliant: No; RoHS Compliant: Yes; ComponentLink1URL: https://datasheet.ciiva.com/24216/c1005x5r0j475m050bc-264348-24216583.pdf?src-supplier=Mouser; ComponentLink1Description: https://datasheet.ciiva.com/24216/c1005x5r0j475m050bc-264348-24216583.pdf?src-supplier=Mouser; ComponentLink2URL: https://datasheet.ciiva.com/5962/639999-5962567.pdf?src-supplier=Farnell; ComponentLink2Description: https://datasheet.ciiva.com/5962/639999-5962567.pdf?src-supplier=Farnell; ComponentLink3URL: https://datasheet.ciiva.com/22648/1796654-22648701.pdf?src-supplier=Element14; ComponentLink3Description: https://datasheet.ciiva.com/22648/1796654-22648701.pdf?src-supplier=Element14; ComponentLink4URL: https://datasheet.ciiva.com/22749/1744655-22749711.pdf?src-supplier=Element14; ComponentLink4Description: https://datasheet.ciiva.com/22749/1744655-22749711.pdf?src-supplier=Element14; ComponentLink5URL: https://datasheet.ciiva.com/7770/639999-7770124.pdf?src-supplier=Element14; ComponentLink5Description: https://datasheet.ciiva.com/7770/639999-7770124.pdf?src-supplier=Element14; ComponentLink6URL: https://datasheet.ciiva.com/6289/tdkmlcccaprange-6289886.pdf?src-supplier=Digi-Key; ComponentLink6Description: https://datasheet.ciiva.com/6289/tdkmlcccaprange-6289886.pdf?src-supplier=Digi-Key; ComponentLink7URL: https://datasheet.ciiva.com/6289/tdkmlcccaprange-6289895.pdf?src-supplier=Digi-Key; ComponentLink7Description: https://datasheet.ciiva.com/6289/tdkmlcccaprange-6289895.pdf?src-supplier=Digi-Key; ComponentLink8URL: https://datasheet.ciiva.com/16425/e412-c-16425670.pdf?src-supplier=Future+Electronics; ComponentLink8Description: https://datasheet.ciiva.com/16425/e412-c-16425670.pdf?src-supplier=Future+Electronics; Supplier Part Number 1: 445-7395-1-ND
footprint CAP_0402_CAPC1005X05N (Chip Capacitor, 2-Leads, Body 1.00x0.50mm, IPC Medium Density)
pins: 1, 2

## CAP_4.7UF_10V_X5R_0402
designator C?, comment Capacitance: 4.7uF  Voltage Rating: 10V  Case/Package: 0402  (hidden comment: CL05A475KP5NRNC)
Multilayer Ceramic Capacitor, 4.7 uF, 10 V, ± 10%, X5R, 0402 [1005 Metric]; Manufacturer: Samsung; Supplier 1: Digikey; Manufacturer Part Number: CL05A475KP5NRNC; RoHS: Yes; Category: Ceramic Capacitors; Stock 1: 748042; Pricing 1: 1=0.28, 10=0.184, 50=0.129, 100=0.1042, 500=0.0774, 1000=0.06772, 2500=0.0645, 5000=0.05966 (USD); Mount: Surface Mount; Case Code (Metric): 1005; Case Code (Imperial): 0402; Material: Ceramic; Min Operating Temperature: -55°C; Max Operating Temperature: 85°C; Tolerance: 10%; Packaging: Tape and Reel; Package Quantity: 1; Dielectric: X5R; Series: CL; Construction: Flat; Length: 1mm; Width: 0.02inch; Height: 0.5mm; Thickness: 0.022inch; Depth: 0.5mm; Radiation Hardening: No; RoHS Compliant: Yes; Lead Free: Lead Free; ComponentLink1URL: https://datasheet.ciiva.com/25724/cl05a475kp5nrnc-25724404.pdf?src-supplier=Digikey; ComponentLink1Description: https://datasheet.ciiva.com/25724/cl05a475kp5nrnc-25724404.pdf?src-supplier=Digikey; ComponentLink2URL: https://datasheet.ciiva.com/29198/458873-da-01-en-vs-kondensator-0402-29198304.pdf?src-supplier=Conrad; ComponentLink2Description: https://datasheet.ciiva.com/29198/458873-da-01-en-vs-kondensator-0402-29198304.pdf?src-supplier=Conrad; Supplier Part Number 1: 1276-1480-1-ND
footprint CAP_0402_CAPC1005X05N (Chip Capacitor, 2-Leads, Body 1.00x0.50mm, IPC Medium Density)
pins: 1, 2

## CAP_4.7UF_10V_X7S_0603
designator C?, comment GRM188C71A475KE11D  Voltage Rating (DC): 10V  Capacitance: 4.7uF  Case/Package: 0603
Multilayer Ceramic Capacitor, 4.7 uF, 10 V, ± 10%, X7S, 0603 [1608 Metric]; Manufacturer: Murata; Supplier 1: Digi-Key; Manufacturer Part Number: GRM188C71A475KE11D; RoHS: Yes; Category: Ceramic Capacitors; Stock 1: 1424657; Pricing 1: 1=0.2, 10=0.132, 50=0.0928, 100=0.075, 500=0.0557, 1000=0.04873 (USD); Mount: Surface Mount; Case Code (Metric): 1608; Material: Ceramic; Case Code (Imperial): 0603; Weight: 0.000222oz; Min Operating Temperature: -55°C; Max Operating Temperature: 125°C; Tolerance: 10%; Packaging: Tape and Reel; Voltage Rating: 10V; Termination: SMD/SMT; Package Quantity: 4000; Series: GRM; Length: 1.6mm; Width: 0.8mm; Height: 0.8mm; Thickness: 0.037inch; RoHS Compliant: Yes; ComponentLink1URL: http://www.mouser.com/ds/2/281/c02e-2905.pdf?src-supplier=Mouser; ComponentLink1Description: http://www.mouser.com/ds/2/281/c02e-2905.pdf?src-supplier=Mouser; ComponentLink2URL: http://search.murata.co.jp/Ceramy/image/img/A01X/G101/ENG/GRM188C71A475KE11-01.pdf?src-supplier=Digi-Key; ComponentLink2Description: http://search.murata.co.jp/Ceramy/image/img/A01X/G101/ENG/GRM188C71A475KE11-01.pdf?src-supplier=Digi-Key; ComponentLink3URL: https://datasheet.octopart.com/GRM188C71A475KE11D-Murata-datasheet-149523139.pdf?src-supplier=Newark; ComponentLink3Description: https://datasheet.octopart.com/GRM188C71A475KE11D-Murata-datasheet-149523139.pdf?src-supplier=Newark; ComponentLink4URL: https://datasheet.octopart.com/GRM188C71A475KE11D-Murata-datasheet-141274558.pdf?src-supplier=Future+Electronics; ComponentLink4Description: https://datasheet.octopart.com/GRM188C71A475KE11D-Murata-datasheet-141274558.pdf?src-supplier=Future+Electronics; Supplier Part Number 1: 490-11992-1-ND; Dielectric: X7S
footprint CAP_0603_CAPC1608X08N (Chip Capacitor, 2-Leads, Body 1.60x0.80mm, IPC Medium Density)
pins: 1, 2

## CAP_4.7UF_16V_X5R_0603
designator C?, comment Voltage: 16V  Capacitance: 4.7uF  Case/Package: 0603  (hidden comment: CL10A475KO8NNNC)